# Altium schematic symbol library jlcpcb_2025_04_capacitors_extended_0201.schlib: 1175 symbols (part 2 of 7) (continued)
## CC0201JRNPO8BN220
designator C?  Capacitance: 22pF  (hidden comment: *)
Capacitor, Ceramic (MLCC), 22pF, ±5%, 25V, NP0, ±5%, SMD 0201; Manufacturer: YAGEO; Manufacturer Part Number: CC0201JRNPO8BN220; Package Size: 0201; JLCPCB Basic Part: No; JLCPCB Part Number: C526934; Supplier 1: LCSC; Category: Capacitors - MLCC; Supplier Part Number 1: C526934; Tolerance: ±5%; Voltage Rating: 25V; Temperature Coefficient: NP0; RoHS: Yes; ComponentLink1Description: Datasheet; ComponentLink1URL: https://wmsc.lcsc.com/wmsc/upload/file/pdf/v2/lcsc/2005222137_YAGEO-CC0201JRNPO8BN220_C526934.pdf; ComponentLink2Description: JLCPCB Part URL; ComponentLink2URL: https://jlcpcb.com/partdetail/C526934; ComponentLink3Description: LCSC Part URL; ComponentLink3URL: https://lcsc.com/product-detail/Multilayer-Ceramic-Capacitors-MLCC---SMD-SMT_YAGEO-YAGEO-CC0201JRNPO8BN220_C526934.html
footprint CAP-0201 (0201 (0603M) Capacitor)
pins: 1, 2

## CC0201JRNPO8BN270
designator C?  Capacitance: 27pF  (hidden comment: *)
Capacitor, Ceramic (MLCC), 27pF, ±5%, 25V, NP0, ±5%, SMD 0201; Manufacturer: YAGEO; Manufacturer Part Number: CC0201JRNPO8BN270; Package Size: 0201; JLCPCB Basic Part: No; JLCPCB Part Number: C272876; Supplier 1: LCSC; Category: Capacitors - MLCC; Supplier Part Number 1: C272876; Tolerance: ±5%; Voltage Rating: 25V; Temperature Coefficient: NP0; RoHS: Yes; ComponentLink1Description: Datasheet; ComponentLink1URL: https://wmsc.lcsc.com/wmsc/upload/file/pdf/v2/lcsc/2304140030_YAGEO-CC0201JRNPO8BN270_C272876.pdf; ComponentLink2Description: JLCPCB Part URL; ComponentLink2URL: https://jlcpcb.com/partdetail/C272876; ComponentLink3Description: LCSC Part URL; ComponentLink3URL: https://lcsc.com/product-detail/Multilayer-Ceramic-Capacitors-MLCC---SMD-SMT_YAGEO-YAGEO-CC0201JRNPO8BN270_C272876.html
footprint CAP-0201 (0201 (0603M) Capacitor)
pins: 1, 2

## CC0201JRNPO8BN330
designator C?  Capacitance: 33pF  (hidden comment: *)
Capacitor, Ceramic (MLCC), 33pF, ±5%, 25V, NP0, ±5%, SMD 0201; Manufacturer: YAGEO; Manufacturer Part Number: CC0201JRNPO8BN330; Package Size: 0201; JLCPCB Basic Part: No; JLCPCB Part Number: C513616; Supplier 1: LCSC; Category: Capacitors - MLCC; Supplier Part Number 1: C513616; Tolerance: ±5%; Voltage Rating: 25V; Temperature Coefficient: NP0; RoHS: Yes; ComponentLink1Description: Datasheet; ComponentLink1URL: https://wmsc.lcsc.com/wmsc/upload/file/pdf/v2/lcsc/2004231433_YAGEO-CC0201JRNPO8BN330_C513616.pdf; ComponentLink2Description: JLCPCB Part URL; ComponentLink2URL: https://jlcpcb.com/partdetail/C513616; ComponentLink3Description: LCSC Part URL; ComponentLink3URL: https://lcsc.com/product-detail/Multilayer-Ceramic-Capacitors-MLCC---SMD-SMT_YAGEO-YAGEO-CC0201JRNPO8BN330_C513616.html
footprint CAP-0201 (0201 (0603M) Capacitor)
pins: 1, 2

## CC0201JRNPO8BN680
designator C?  Capacitance: 68pF  (hidden comment: *)
Capacitor, Ceramic (MLCC), 68pF, ±5%, 25V, NP0, ±5%, SMD 0201; Manufacturer: YAGEO; Manufacturer Part Number: CC0201JRNPO8BN680; Package Size: 0201; JLCPCB Basic Part: No; JLCPCB Part Number: C309452; Supplier 1: LCSC; Category: Capacitors - MLCC; Supplier Part Number 1: C309452; Tolerance: ±5%; Voltage Rating: 25V; Temperature Coefficient: NP0; RoHS: Yes; ComponentLink1Description: Datasheet; ComponentLink1URL: https://wmsc.lcsc.com/wmsc/upload/file/pdf/v2/lcsc/2304140030_YAGEO-CC0201JRNPO8BN680_C309452.pdf; ComponentLink2Description: JLCPCB Part URL; ComponentLink2URL: https://jlcpcb.com/partdetail/C309452; ComponentLink3Description: LCSC Part URL; ComponentLink3URL: https://lcsc.com/product-detail/Multilayer-Ceramic-Capacitors-MLCC---SMD-SMT_YAGEO-YAGEO-CC0201JRNPO8BN680_C309452.html
footprint CAP-0201 (0201 (0603M) Capacitor)
pins: 1, 2

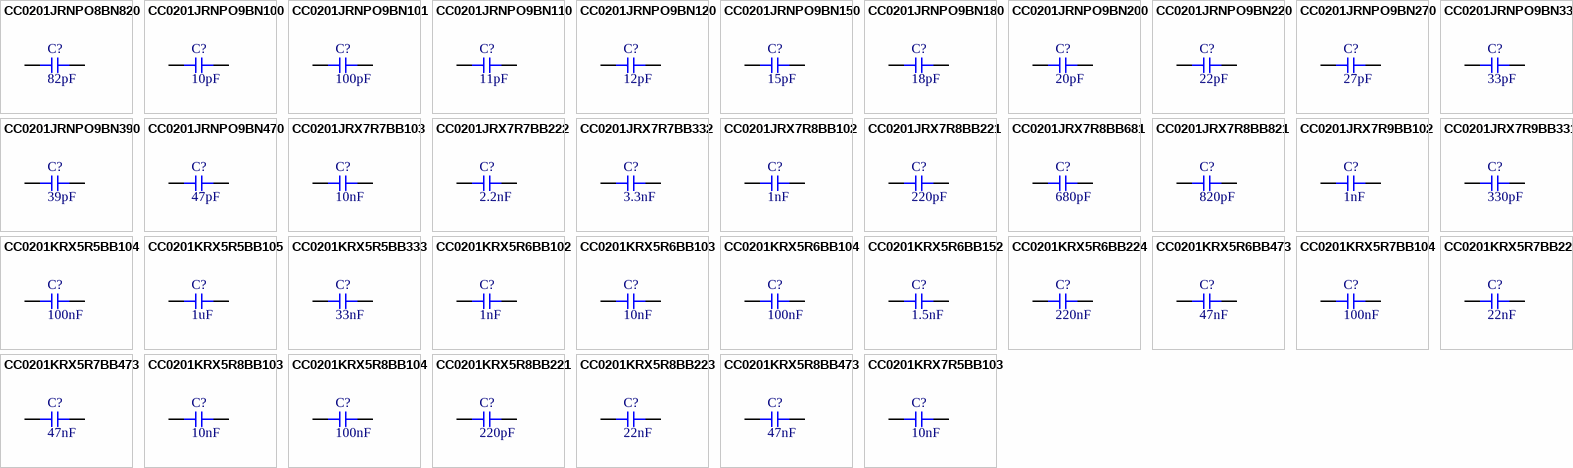
[diagram p7: symbols CC0201JRNPO8BN820 to CC0201KRX7R5BB103]

## CC0201JRNPO8BN820
designator C?  Capacitance: 82pF  (hidden comment: *)
Capacitor, Ceramic (MLCC), 82pF, ±5%, 25V, NP0, ±5%, SMD 0201; Manufacturer: YAGEO; Manufacturer Part Number: CC0201JRNPO8BN820; Package Size: 0201; JLCPCB Basic Part: No; JLCPCB Part Number: C526938; Supplier 1: LCSC; Category: Capacitors - MLCC; Supplier Part Number 1: C526938; Tolerance: ±5%; Voltage Rating: 25V; Temperature Coefficient: NP0; RoHS: Yes; ComponentLink1Description: Datasheet; ComponentLink1URL: https://wmsc.lcsc.com/wmsc/upload/file/pdf/v2/lcsc/2006101834_YAGEO-CC0201JRNPO8BN820_C526938.pdf; ComponentLink2Description: JLCPCB Part URL; ComponentLink2URL: https://jlcpcb.com/partdetail/C526938; ComponentLink3Description: LCSC Part URL; ComponentLink3URL: https://lcsc.com/product-detail/Multilayer-Ceramic-Capacitors-MLCC---SMD-SMT_YAGEO-YAGEO-CC0201JRNPO8BN820_C526938.html
footprint CAP-0201 (0201 (0603M) Capacitor)
pins: 1, 2

## CC0201JRNPO9BN100
designator C?  Capacitance: 10pF  (hidden comment: *)
Capacitor, Ceramic (MLCC), 10pF, ±5%, 50V, NP0, ±5%, SMD 0201; Manufacturer: YAGEO; Manufacturer Part Number: CC0201JRNPO9BN100; Package Size: 0201; JLCPCB Basic Part: No; JLCPCB Part Number: C272871; Supplier 1: LCSC; Category: Capacitors - MLCC; Supplier Part Number 1: C272871; Tolerance: ±5%; Voltage Rating: 50V; Temperature Coefficient: NP0; RoHS: Yes; ComponentLink1Description: Datasheet; ComponentLink1URL: https://wmsc.lcsc.com/wmsc/upload/file/pdf/v2/lcsc/2304140030_YAGEO-CC0201JRNPO9BN100_C272871.pdf; ComponentLink2Description: JLCPCB Part URL; ComponentLink2URL: https://jlcpcb.com/partdetail/C272871; ComponentLink3Description: LCSC Part URL; ComponentLink3URL: https://lcsc.com/product-detail/Multilayer-Ceramic-Capacitors-MLCC---SMD-SMT_YAGEO-YAGEO-CC0201JRNPO9BN100_C272871.html
footprint CAP-0201 (0201 (0603M) Capacitor)
pins: 1, 2

## CC0201JRNPO9BN101
designator C?  Capacitance: 100pF  (hidden comment: *)
Capacitor, Ceramic (MLCC), 100pF, ±5%, 50V, NP0, ±5%, SMD 0201; Manufacturer: YAGEO; Manufacturer Part Number: CC0201JRNPO9BN101; Package Size: 0201; JLCPCB Basic Part: No; JLCPCB Part Number: C272870; Supplier 1: LCSC; Category: Capacitors - MLCC; Supplier Part Number 1: C272870; Tolerance: ±5%; Voltage Rating: 50V; Temperature Coefficient: NP0; RoHS: Yes; ComponentLink1Description: Datasheet; ComponentLink1URL: https://wmsc.lcsc.com/wmsc/upload/file/pdf/v2/lcsc/2304140030_YAGEO-CC0201JRNPO9BN101_C272870.pdf; ComponentLink2Description: JLCPCB Part URL; ComponentLink2URL: https://jlcpcb.com/partdetail/C272870; ComponentLink3Description: LCSC Part URL; ComponentLink3URL: https://lcsc.com/product-detail/Multilayer-Ceramic-Capacitors-MLCC---SMD-SMT_YAGEO-YAGEO-CC0201JRNPO9BN101_C272870.html
footprint CAP-0201 (0201 (0603M) Capacitor)
pins: 1, 2

## CC0201JRNPO9BN110
designator C?  Capacitance: 11pF  (hidden comment: *)
Capacitor, Ceramic (MLCC), 11pF, ±5%, 50V, NP0, ±5%, SMD 0201; Manufacturer: YAGEO; Manufacturer Part Number: CC0201JRNPO9BN110; Package Size: 0201; JLCPCB Basic Part: No; JLCPCB Part Number: C541208; Supplier 1: LCSC; Category: Capacitors - MLCC; Supplier Part Number 1: C541208; Tolerance: ±5%; Voltage Rating: 50V; Temperature Coefficient: NP0; RoHS: Yes; ComponentLink1Description: Datasheet; ComponentLink1URL: https://wmsc.lcsc.com/wmsc/upload/file/pdf/v2/lcsc/2006151109_YAGEO-CC0201JRNPO9BN110_C541208.pdf; ComponentLink2Description: JLCPCB Part URL; ComponentLink2URL: https://jlcpcb.com/partdetail/C541208; ComponentLink3Description: LCSC Part URL; ComponentLink3URL: https://lcsc.com/product-detail/Multilayer-Ceramic-Capacitors-MLCC---SMD-SMT_YAGEO-YAGEO-CC0201JRNPO9BN110_C541208.html
footprint CAP-0201 (0201 (0603M) Capacitor)
pins: 1, 2

## CC0201JRNPO9BN120
designator C?  Capacitance: 12pF  (hidden comment: *)
Capacitor, Ceramic (MLCC), 12pF, ±5%, 50V, NP0, ±5%, SMD 0201; Manufacturer: YAGEO; Manufacturer Part Number: CC0201JRNPO9BN120; Package Size: 0201; JLCPCB Basic Part: No; JLCPCB Part Number: C277478; Supplier 1: LCSC; Category: Capacitors - MLCC; Supplier Part Number 1: C277478; Tolerance: ±5%; Voltage Rating: 50V; Temperature Coefficient: NP0; RoHS: Yes; ComponentLink1Description: Datasheet; ComponentLink1URL: https://wmsc.lcsc.com/wmsc/upload/file/pdf/v2/lcsc/2304140030_YAGEO-CC0201JRNPO9BN120_C277478.pdf; ComponentLink2Description: JLCPCB Part URL; ComponentLink2URL: https://jlcpcb.com/partdetail/C277478; ComponentLink3Description: LCSC Part URL; ComponentLink3URL: https://lcsc.com/product-detail/Multilayer-Ceramic-Capacitors-MLCC---SMD-SMT_YAGEO-YAGEO-CC0201JRNPO9BN120_C277478.html
footprint CAP-0201 (0201 (0603M) Capacitor)
pins: 1, 2

## CC0201JRNPO9BN150
designator C?  Capacitance: 15pF  (hidden comment: *)
Capacitor, Ceramic (MLCC), 15pF, ±5%, 50V, NP0, ±5%, SMD 0201; Manufacturer: YAGEO; Manufacturer Part Number: CC0201JRNPO9BN150; Package Size: 0201; JLCPCB Basic Part: No; JLCPCB Part Number: C277480; Supplier 1: LCSC; Category: Capacitors - MLCC; Supplier Part Number 1: C277480; Tolerance: ±5%; Voltage Rating: 50V; Temperature Coefficient: NP0; RoHS: Yes; ComponentLink1Description: Datasheet; ComponentLink1URL: https://wmsc.lcsc.com/wmsc/upload/file/pdf/v2/lcsc/2304140030_YAGEO-CC0201JRNPO9BN150_C277480.pdf; ComponentLink2Description: JLCPCB Part URL; ComponentLink2URL: https://jlcpcb.com/partdetail/C277480; ComponentLink3Description: LCSC Part URL; ComponentLink3URL: https://lcsc.com/product-detail/Multilayer-Ceramic-Capacitors-MLCC---SMD-SMT_YAGEO-YAGEO-CC0201JRNPO9BN150_C277480.html
footprint CAP-0201 (0201 (0603M) Capacitor)
pins: 1, 2

## CC0201JRNPO9BN180
designator C?  Capacitance: 18pF  (hidden comment: *)
Capacitor, Ceramic (MLCC), 18pF, ±5%, 50V, NP0, ±5%, SMD 0201; Manufacturer: YAGEO; Manufacturer Part Number: CC0201JRNPO9BN180; Package Size: 0201; JLCPCB Basic Part: No; JLCPCB Part Number: C277474; Supplier 1: LCSC; Category: Capacitors - MLCC; Supplier Part Number 1: C277474; Tolerance: ±5%; Voltage Rating: 50V; Temperature Coefficient: NP0; RoHS: Yes; ComponentLink1Description: Datasheet; ComponentLink1URL: https://wmsc.lcsc.com/wmsc/upload/file/pdf/v2/lcsc/2304140030_YAGEO-CC0201JRNPO9BN180_C277474.pdf; ComponentLink2Description: JLCPCB Part URL; ComponentLink2URL: https://jlcpcb.com/partdetail/C277474; ComponentLink3Description: LCSC Part URL; ComponentLink3URL: https://lcsc.com/product-detail/Multilayer-Ceramic-Capacitors-MLCC---SMD-SMT_YAGEO-YAGEO-CC0201JRNPO9BN180_C277474.html
footprint CAP-0201 (0201 (0603M) Capacitor)
pins: 1, 2

## CC0201JRNPO9BN200
designator C?  Capacitance: 20pF  (hidden comment: *)
Capacitor, Ceramic (MLCC), 20pF, ±5%, 50V, NP0, ±5%, SMD 0201; Manufacturer: YAGEO; Manufacturer Part Number: CC0201JRNPO9BN200; Package Size: 0201; JLCPCB Basic Part: No; JLCPCB Part Number: C325444; Supplier 1: LCSC; Category: Capacitors - MLCC; Supplier Part Number 1: C325444; Tolerance: ±5%; Voltage Rating: 50V; Temperature Coefficient: NP0; RoHS: Yes; ComponentLink1Description: Datasheet; ComponentLink1URL: https://wmsc.lcsc.com/wmsc/upload/file/pdf/v2/lcsc/1811031142_YAGEO-CC0201JRNPO9BN200_C325444.pdf; ComponentLink2Description: JLCPCB Part URL; ComponentLink2URL: https://jlcpcb.com/partdetail/C325444; ComponentLink3Description: LCSC Part URL; ComponentLink3URL: https://lcsc.com/product-detail/Multilayer-Ceramic-Capacitors-MLCC---SMD-SMT_YAGEO-YAGEO-CC0201JRNPO9BN200_C325444.html
footprint CAP-0201 (0201 (0603M) Capacitor)
pins: 1, 2

## CC0201JRNPO9BN220
designator C?  Capacitance: 22pF  (hidden comment: *)
Capacitor, Ceramic (MLCC), 22pF, ±5%, 50V, NP0, ±5%, SMD 0201; Manufacturer: YAGEO; Manufacturer Part Number: CC0201JRNPO9BN220; Package Size: 0201; JLCPCB Basic Part: No; JLCPCB Part Number: C272881; Supplier 1: LCSC; Category: Capacitors - MLCC; Supplier Part Number 1: C272881; Tolerance: ±5%; Voltage Rating: 50V; Temperature Coefficient: NP0; RoHS: Yes; ComponentLink1Description: Datasheet; ComponentLink1URL: https://wmsc.lcsc.com/wmsc/upload/file/pdf/v2/lcsc/2304140030_YAGEO-CC0201JRNPO9BN220_C272881.pdf; ComponentLink2Description: JLCPCB Part URL; ComponentLink2URL: https://jlcpcb.com/partdetail/C272881; ComponentLink3Description: LCSC Part URL; ComponentLink3URL: https://lcsc.com/product-detail/Multilayer-Ceramic-Capacitors-MLCC---SMD-SMT_YAGEO-YAGEO-CC0201JRNPO9BN220_C272881.html
footprint CAP-0201 (0201 (0603M) Capacitor)
pins: 1, 2

## CC0201JRNPO9BN270
designator C?  Capacitance: 27pF  (hidden comment: *)
Capacitor, Ceramic (MLCC), 27pF, ±5%, 50V, NP0, ±5%, SMD 0201; Manufacturer: YAGEO; Manufacturer Part Number: CC0201JRNPO9BN270; Package Size: 0201; JLCPCB Basic Part: No; JLCPCB Part Number: C272868; Supplier 1: LCSC; Category: Capacitors - MLCC; Supplier Part Number 1: C272868; Tolerance: ±5%; Voltage Rating: 50V; Temperature Coefficient: NP0; RoHS: Yes; ComponentLink1Description: Datasheet; ComponentLink1URL: https://wmsc.lcsc.com/wmsc/upload/file/pdf/v2/lcsc/2304140030_YAGEO-CC0201JRNPO9BN270_C272868.pdf; ComponentLink2Description: JLCPCB Part URL; ComponentLink2URL: https://jlcpcb.com/partdetail/C272868; ComponentLink3Description: LCSC Part URL; ComponentLink3URL: https://lcsc.com/product-detail/Multilayer-Ceramic-Capacitors-MLCC---SMD-SMT_YAGEO-YAGEO-CC0201JRNPO9BN270_C272868.html
footprint CAP-0201 (0201 (0603M) Capacitor)
pins: 1, 2

## CC0201JRNPO9BN330
designator C?  Capacitance: 33pF  (hidden comment: *)
Capacitor, Ceramic (MLCC), 33pF, ±5%, 50V, NP0, ±5%, SMD 0201; Manufacturer: YAGEO; Manufacturer Part Number: CC0201JRNPO9BN330; Package Size: 0201; JLCPCB Basic Part: No; JLCPCB Part Number: C277477; Supplier 1: LCSC; Category: Capacitors - MLCC; Supplier Part Number 1: C277477; Tolerance: ±5%; Voltage Rating: 50V; Temperature Coefficient: NP0; RoHS: Yes; ComponentLink1Description: Datasheet; ComponentLink1URL: https://wmsc.lcsc.com/wmsc/upload/file/pdf/v2/lcsc/2304140030_YAGEO-CC0201JRNPO9BN330_C277477.pdf; ComponentLink2Description: JLCPCB Part URL; ComponentLink2URL: https://jlcpcb.com/partdetail/C277477; ComponentLink3Description: LCSC Part URL; ComponentLink3URL: https://lcsc.com/product-detail/Multilayer-Ceramic-Capacitors-MLCC---SMD-SMT_YAGEO-YAGEO-CC0201JRNPO9BN330_C277477.html
footprint CAP-0201 (0201 (0603M) Capacitor)
pins: 1, 2

## CC0201JRNPO9BN390
designator C?  Capacitance: 39pF  (hidden comment: *)
Capacitor, Ceramic (MLCC), 39pF, ±5%, 50V, NP0, ±5%, SMD 0201; Manufacturer: YAGEO; Manufacturer Part Number: CC0201JRNPO9BN390; Package Size: 0201; JLCPCB Basic Part: No; JLCPCB Part Number: C277472; Supplier 1: LCSC; Category: Capacitors - MLCC; Supplier Part Number 1: C277472; Tolerance: ±5%; Voltage Rating: 50V; Temperature Coefficient: NP0; RoHS: Yes; ComponentLink1Description: Datasheet; ComponentLink1URL: https://wmsc.lcsc.com/wmsc/upload/file/pdf/v2/lcsc/2304140030_YAGEO-CC0201JRNPO9BN390_C277472.pdf; ComponentLink2Description: JLCPCB Part URL; ComponentLink2URL: https://jlcpcb.com/partdetail/C277472; ComponentLink3Description: LCSC Part URL; ComponentLink3URL: https://lcsc.com/product-detail/Multilayer-Ceramic-Capacitors-MLCC---SMD-SMT_YAGEO-YAGEO-CC0201JRNPO9BN390_C277472.html
footprint CAP-0201 (0201 (0603M) Capacitor)
pins: 1, 2

## CC0201JRNPO9BN470
designator C?  Capacitance: 47pF  (hidden comment: *)
Capacitor, Ceramic (MLCC), 47pF, ±5%, 50V, NP0, ±5%, SMD 0201; Manufacturer: YAGEO; Manufacturer Part Number: CC0201JRNPO9BN470; Package Size: 0201; JLCPCB Basic Part: No; JLCPCB Part Number: C272867; Supplier 1: LCSC; Category: Capacitors - MLCC; Supplier Part Number 1: C272867; Tolerance: ±5%; Voltage Rating: 50V; Temperature Coefficient: NP0; RoHS: Yes; ComponentLink1Description: Datasheet; ComponentLink1URL: https://wmsc.lcsc.com/wmsc/upload/file/pdf/v2/lcsc/2304140030_YAGEO-CC0201JRNPO9BN470_C272867.pdf; ComponentLink2Description: JLCPCB Part URL; ComponentLink2URL: https://jlcpcb.com/partdetail/C272867; ComponentLink3Description: LCSC Part URL; ComponentLink3URL: https://lcsc.com/product-detail/Multilayer-Ceramic-Capacitors-MLCC---SMD-SMT_YAGEO-YAGEO-CC0201JRNPO9BN470_C272867.html
footprint CAP-0201 (0201 (0603M) Capacitor)
pins: 1, 2

## CC0201JRX7R7BB103
designator C?  Capacitance: 10nF  (hidden comment: *)
Capacitor, Ceramic (MLCC), 10nF, ±5%, 16V, X7R, ±5%, SMD 0201; Manufacturer: YAGEO; Manufacturer Part Number: CC0201JRX7R7BB103; Package Size: 0201; JLCPCB Basic Part: No; JLCPCB Part Number: C526939; Supplier 1: LCSC; Category: Capacitors - MLCC; Supplier Part Number 1: C526939; Tolerance: ±5%; Voltage Rating: 16V; Temperature Coefficient: X7R; RoHS: Yes; ComponentLink1Description: Datasheet; ComponentLink1URL: https://wmsc.lcsc.com/wmsc/upload/file/pdf/v2/lcsc/2005222137_YAGEO-CC0201JRX7R7BB103_C526939.pdf; ComponentLink2Description: JLCPCB Part URL; ComponentLink2URL: https://jlcpcb.com/partdetail/C526939; ComponentLink3Description: LCSC Part URL; ComponentLink3URL: https://lcsc.com/product-detail/Multilayer-Ceramic-Capacitors-MLCC---SMD-SMT_YAGEO-YAGEO-CC0201JRX7R7BB103_C526939.html
footprint CAP-0201 (0201 (0603M) Capacitor)
pins: 1, 2

## CC0201JRX7R7BB222
designator C?  Capacitance: 2.2nF  (hidden comment: *)
Capacitor, Ceramic (MLCC), 2.2nF, ±5%, 16V, X7R, ±5%, SMD 0201; Manufacturer: YAGEO; Manufacturer Part Number: CC0201JRX7R7BB222; Package Size: 0201; JLCPCB Basic Part: No; JLCPCB Part Number: C526940; Supplier 1: LCSC; Category: Capacitors - MLCC; Supplier Part Number 1: C526940; Tolerance: ±5%; Voltage Rating: 16V; Temperature Coefficient: X7R; RoHS: Yes; ComponentLink1Description: Datasheet; ComponentLink1URL: https://wmsc.lcsc.com/wmsc/upload/file/pdf/v2/lcsc/2005261832_YAGEO-CC0201JRX7R7BB222_C526940.pdf; ComponentLink2Description: JLCPCB Part URL; ComponentLink2URL: https://jlcpcb.com/partdetail/C526940; ComponentLink3Description: LCSC Part URL; ComponentLink3URL: https://lcsc.com/product-detail/Multilayer-Ceramic-Capacitors-MLCC---SMD-SMT_YAGEO-YAGEO-CC0201JRX7R7BB222_C526940.html
footprint CAP-0201 (0201 (0603M) Capacitor)
pins: 1, 2

## CC0201JRX7R7BB332
designator C?  Capacitance: 3.3nF  (hidden comment: *)
Capacitor, Ceramic (MLCC), 3.3nF, ±5%, 16V, X7R, ±5%, SMD 0201; Manufacturer: YAGEO; Manufacturer Part Number: CC0201JRX7R7BB332; Package Size: 0201; JLCPCB Basic Part: No; JLCPCB Part Number: C541322; Supplier 1: LCSC; Category: Capacitors - MLCC; Supplier Part Number 1: C541322; Tolerance: ±5%; Voltage Rating: 16V; Temperature Coefficient: X7R; RoHS: Yes; ComponentLink1Description: Datasheet; ComponentLink1URL: https://wmsc.lcsc.com/wmsc/upload/file/pdf/v2/lcsc/2006151110_YAGEO-CC0201JRX7R7BB332_C541322.pdf; ComponentLink2Description: JLCPCB Part URL; ComponentLink2URL: https://jlcpcb.com/partdetail/C541322; ComponentLink3Description: LCSC Part URL; ComponentLink3URL: https://lcsc.com/product-detail/Multilayer-Ceramic-Capacitors-MLCC---SMD-SMT_YAGEO-YAGEO-CC0201JRX7R7BB332_C541322.html
footprint CAP-0201 (0201 (0603M) Capacitor)
pins: 1, 2

## CC0201JRX7R8BB102
designator C?  Capacitance: 1nF  (hidden comment: *)
Capacitor, Ceramic (MLCC), 1nF, ±5%, 25V, X7R, ±5%, SMD 0201; Manufacturer: YAGEO; Manufacturer Part Number: CC0201JRX7R8BB102; Package Size: 0201; JLCPCB Basic Part: No; JLCPCB Part Number: C526941; Supplier 1: LCSC; Category: Capacitors - MLCC; Supplier Part Number 1: C526941; Tolerance: ±5%; Voltage Rating: 25V; Temperature Coefficient: X7R; RoHS: Yes; ComponentLink1Description: Datasheet; ComponentLink1URL: https://wmsc.lcsc.com/wmsc/upload/file/pdf/v2/lcsc/2005141732_YAGEO-CC0201JRX7R8BB102_C526941.pdf; ComponentLink2Description: JLCPCB Part URL; ComponentLink2URL: https://jlcpcb.com/partdetail/C526941; ComponentLink3Description: LCSC Part URL; ComponentLink3URL: https://lcsc.com/product-detail/Multilayer-Ceramic-Capacitors-MLCC---SMD-SMT_YAGEO-YAGEO-CC0201JRX7R8BB102_C526941.html
footprint CAP-0201 (0201 (0603M) Capacitor)
pins: 1, 2

## CC0201JRX7R8BB221
designator C?  Capacitance: 220pF  (hidden comment: *)
Capacitor, Ceramic (MLCC), 220pF, ±5%, 25V, X7R, ±5%, SMD 0201; Manufacturer: YAGEO; Manufacturer Part Number: CC0201JRX7R8BB221; Package Size: 0201; JLCPCB Basic Part: No; JLCPCB Part Number: C541323; Supplier 1: LCSC; Category: Capacitors - MLCC; Supplier Part Number 1: C541323; Tolerance: ±5%; Voltage Rating: 25V; Temperature Coefficient: X7R; RoHS: Yes; ComponentLink1Description: Datasheet; ComponentLink1URL: https://wmsc.lcsc.com/wmsc/upload/file/pdf/v2/lcsc/2006151110_YAGEO-CC0201JRX7R8BB221_C541323.pdf; ComponentLink2Description: JLCPCB Part URL; ComponentLink2URL: https://jlcpcb.com/partdetail/C541323; ComponentLink3Description: LCSC Part URL; ComponentLink3URL: https://lcsc.com/product-detail/Multilayer-Ceramic-Capacitors-MLCC---SMD-SMT_YAGEO-YAGEO-CC0201JRX7R8BB221_C541323.html
footprint CAP-0201 (0201 (0603M) Capacitor)
pins: 1, 2

## CC0201JRX7R8BB681
designator C?  Capacitance: 680pF  (hidden comment: *)
Capacitor, Ceramic (MLCC), 680pF, ±5%, 25V, X7R, ±5%, SMD 0201; Manufacturer: YAGEO; Manufacturer Part Number: CC0201JRX7R8BB681; Package Size: 0201; JLCPCB Basic Part: No; JLCPCB Part Number: C541326; Supplier 1: LCSC; Category: Capacitors - MLCC; Supplier Part Number 1: C541326; Tolerance: ±5%; Voltage Rating: 25V; Temperature Coefficient: X7R; RoHS: Yes; ComponentLink1Description: Datasheet; ComponentLink1URL: https://wmsc.lcsc.com/wmsc/upload/file/pdf/v2/lcsc/2006151111_YAGEO-CC0201JRX7R8BB681_C541326.pdf; ComponentLink2Description: JLCPCB Part URL; ComponentLink2URL: https://jlcpcb.com/partdetail/C541326; ComponentLink3Description: LCSC Part URL; ComponentLink3URL: https://lcsc.com/product-detail/Multilayer-Ceramic-Capacitors-MLCC---SMD-SMT_YAGEO-YAGEO-CC0201JRX7R8BB681_C541326.html
footprint CAP-0201 (0201 (0603M) Capacitor)
pins: 1, 2

## CC0201JRX7R8BB821
designator C?  Capacitance: 820pF  (hidden comment: *)
Capacitor, Ceramic (MLCC), 820pF, ±5%, 25V, X7R, ±5%, SMD 0201; Manufacturer: YAGEO; Manufacturer Part Number: CC0201JRX7R8BB821; Package Size: 0201; JLCPCB Basic Part: No; JLCPCB Part Number: C541327; Supplier 1: LCSC; Category: Capacitors - MLCC; Supplier Part Number 1: C541327; Tolerance: ±5%; Voltage Rating: 25V; Temperature Coefficient: X7R; RoHS: Yes; ComponentLink1Description: Datasheet; ComponentLink1URL: https://wmsc.lcsc.com/wmsc/upload/file/pdf/v2/lcsc/2006151111_YAGEO-CC0201JRX7R8BB821_C541327.pdf; ComponentLink2Description: JLCPCB Part URL; ComponentLink2URL: https://jlcpcb.com/partdetail/C541327; ComponentLink3Description: LCSC Part URL; ComponentLink3URL: https://lcsc.com/product-detail/Multilayer-Ceramic-Capacitors-MLCC---SMD-SMT_YAGEO-YAGEO-CC0201JRX7R8BB821_C541327.html
footprint CAP-0201 (0201 (0603M) Capacitor)
pins: 1, 2

## CC0201JRX7R9BB102
designator C?  Capacitance: 1nF  (hidden comment: *)
Capacitor, Ceramic (MLCC), 1nF, ±5%, 50V, X7R, ±5%, SMD 0201; Manufacturer: YAGEO; Manufacturer Part Number: CC0201JRX7R9BB102; Package Size: 0201; JLCPCB Basic Part: No; JLCPCB Part Number: C541320; Supplier 1: LCSC; Category: Capacitors - MLCC; Supplier Part Number 1: C541320; Tolerance: ±5%; Voltage Rating: 50V; Temperature Coefficient: X7R; RoHS: Yes; ComponentLink1Description: Datasheet; ComponentLink1URL: https://wmsc.lcsc.com/wmsc/upload/file/pdf/v2/lcsc/2006151110_YAGEO-CC0201JRX7R9BB102_C541320.pdf; ComponentLink2Description: JLCPCB Part URL; ComponentLink2URL: https://jlcpcb.com/partdetail/C541320; ComponentLink3Description: LCSC Part URL; ComponentLink3URL: https://lcsc.com/product-detail/Multilayer-Ceramic-Capacitors-MLCC---SMD-SMT_YAGEO-YAGEO-CC0201JRX7R9BB102_C541320.html
footprint CAP-0201 (0201 (0603M) Capacitor)
pins: 1, 2

## CC0201JRX7R9BB331
designator C?  Capacitance: 330pF  (hidden comment: *)
Capacitor, Ceramic (MLCC), 330pF, ±5%, 50V, X7R, ±5%, SMD 0201; Manufacturer: YAGEO; Manufacturer Part Number: CC0201JRX7R9BB331; Package Size: 0201; JLCPCB Basic Part: No; JLCPCB Part Number: C526943; Supplier 1: LCSC; Category: Capacitors - MLCC; Supplier Part Number 1: C526943; Tolerance: ±5%; Voltage Rating: 50V; Temperature Coefficient: X7R; RoHS: Yes; ComponentLink1Description: Datasheet; ComponentLink1URL: https://wmsc.lcsc.com/wmsc/upload/file/pdf/v2/lcsc/2006101834_YAGEO-CC0201JRX7R9BB331_C526943.pdf; ComponentLink2Description: JLCPCB Part URL; ComponentLink2URL: https://jlcpcb.com/partdetail/C526943; ComponentLink3Description: LCSC Part URL; ComponentLink3URL: https://lcsc.com/product-detail/Multilayer-Ceramic-Capacitors-MLCC---SMD-SMT_YAGEO-YAGEO-CC0201JRX7R9BB331_C526943.html
footprint CAP-0201 (0201 (0603M) Capacitor)
pins: 1, 2

## CC0201KRX5R5BB104
designator C?  Capacitance: 100nF  (hidden comment: *)
Capacitor, Ceramic (MLCC), 100nF, ±10%, 6.3V, X5R, ±10%, SMD 0201; Manufacturer: YAGEO; Manufacturer Part Number: CC0201KRX5R5BB104; Package Size: 0201; JLCPCB Basic Part: No; JLCPCB Part Number: C190187; Supplier 1: LCSC; Category: Capacitors - MLCC; Supplier Part Number 1: C190187; Tolerance: ±10%; Voltage Rating: 6.3V; Temperature Coefficient: X5R; RoHS: Yes; ComponentLink1Description: Datasheet; ComponentLink1URL: https://wmsc.lcsc.com/wmsc/upload/file/pdf/v2/lcsc/2407081117_YAGEO-CC0201KRX5R5BB104_C190187.pdf; ComponentLink2Description: JLCPCB Part URL; ComponentLink2URL: https://jlcpcb.com/partdetail/C190187; ComponentLink3Description: LCSC Part URL; ComponentLink3URL: https://lcsc.com/product-detail/Multilayer-Ceramic-Capacitors-MLCC---SMD-SMT_YAGEO-YAGEO-CC0201KRX5R5BB104_C190187.html
footprint CAP-0201 (0201 (0603M) Capacitor)
pins: 1, 2

## CC0201KRX5R5BB105
designator C?  Capacitance: 1uF  (hidden comment: *)
Capacitor, Ceramic (MLCC), 1uF, ±10%, 6.3V, X5R, ±10%, SMD 0201; Manufacturer: YAGEO; Manufacturer Part Number: CC0201KRX5R5BB105; Package Size: 0201; JLCPCB Basic Part: No; JLCPCB Part Number: C541330; Supplier 1: LCSC; Category: Capacitors - MLCC; Supplier Part Number 1: C541330; Tolerance: ±10%; Voltage Rating: 6.3V; Temperature Coefficient: X5R; RoHS: Yes; ComponentLink1Description: Datasheet; ComponentLink1URL: https://wmsc.lcsc.com/wmsc/upload/file/pdf/v2/lcsc/2407081117_YAGEO-CC0201KRX5R5BB105_C541330.pdf; ComponentLink2Description: JLCPCB Part URL; ComponentLink2URL: https://jlcpcb.com/partdetail/C541330; ComponentLink3Description: LCSC Part URL; ComponentLink3URL: https://lcsc.com/product-detail/Multilayer-Ceramic-Capacitors-MLCC---SMD-SMT_YAGEO-YAGEO-CC0201KRX5R5BB105_C541330.html
footprint CAP-0201 (0201 (0603M) Capacitor)
pins: 1, 2

## CC0201KRX5R5BB333
designator C?  Capacitance: 33nF  (hidden comment: *)
Capacitor, Ceramic (MLCC), 33nF, ±10%, 6.3V, X5R, ±10%, SMD 0201; Manufacturer: YAGEO; Manufacturer Part Number: CC0201KRX5R5BB333; Package Size: 0201; JLCPCB Basic Part: No; JLCPCB Part Number: C505507; Supplier 1: LCSC; Category: Capacitors - MLCC; Supplier Part Number 1: C505507; Tolerance: ±10%; Voltage Rating: 6.3V; Temperature Coefficient: X5R; RoHS: Yes; ComponentLink1Description: Datasheet; ComponentLink1URL: https://wmsc.lcsc.com/wmsc/upload/file/pdf/v2/lcsc/2407081117_YAGEO-CC0201KRX5R5BB333_C505507.pdf; ComponentLink2Description: JLCPCB Part URL; ComponentLink2URL: https://jlcpcb.com/partdetail/C505507; ComponentLink3Description: LCSC Part URL; ComponentLink3URL: https://lcsc.com/product-detail/Multilayer-Ceramic-Capacitors-MLCC---SMD-SMT_YAGEO-YAGEO-CC0201KRX5R5BB333_C505507.html
footprint CAP-0201 (0201 (0603M) Capacitor)
pins: 1, 2

## CC0201KRX5R6BB102
designator C?  Capacitance: 1nF  (hidden comment: *)
Capacitor, Ceramic (MLCC), 1nF, ±10%, 10V, X5R, ±10%, SMD 0201; Manufacturer: YAGEO; Manufacturer Part Number: CC0201KRX5R6BB102; Package Size: 0201; JLCPCB Basic Part: No; JLCPCB Part Number: C541212; Supplier 1: LCSC; Category: Capacitors - MLCC; Supplier Part Number 1: C541212; Tolerance: ±10%; Voltage Rating: 10V; Temperature Coefficient: X5R; RoHS: Yes; ComponentLink1Description: Datasheet; ComponentLink1URL: https://wmsc.lcsc.com/wmsc/upload/file/pdf/v2/lcsc/2407081117_YAGEO-CC0201KRX5R6BB102_C541212.pdf; ComponentLink2Description: JLCPCB Part URL; ComponentLink2URL: https://jlcpcb.com/partdetail/C541212; ComponentLink3Description: LCSC Part URL; ComponentLink3URL: https://lcsc.com/product-detail/Multilayer-Ceramic-Capacitors-MLCC---SMD-SMT_YAGEO-YAGEO-CC0201KRX5R6BB102_C541212.html
footprint CAP-0201 (0201 (0603M) Capacitor)
pins: 1, 2

## CC0201KRX5R6BB103
designator C?  Capacitance: 10nF  (hidden comment: *)
Capacitor, Ceramic (MLCC), 10nF, ±10%, 10V, X5R, ±10%, SMD 0201; Manufacturer: YAGEO; Manufacturer Part Number: CC0201KRX5R6BB103; Package Size: 0201; JLCPCB Basic Part: No; JLCPCB Part Number: C272885; Supplier 1: LCSC; Category: Capacitors - MLCC; Supplier Part Number 1: C272885; Tolerance: ±10%; Voltage Rating: 10V; Temperature Coefficient: X5R; RoHS: Yes; ComponentLink1Description: Datasheet; ComponentLink1URL: https://wmsc.lcsc.com/wmsc/upload/file/pdf/v2/lcsc/2407081117_YAGEO-CC0201KRX5R6BB103_C272885.pdf; ComponentLink2Description: JLCPCB Part URL; ComponentLink2URL: https://jlcpcb.com/partdetail/C272885; ComponentLink3Description: LCSC Part URL; ComponentLink3URL: https://lcsc.com/product-detail/Multilayer-Ceramic-Capacitors-MLCC---SMD-SMT_YAGEO-YAGEO-CC0201KRX5R6BB103_C272885.html
footprint CAP-0201 (0201 (0603M) Capacitor)
pins: 1, 2

## CC0201KRX5R6BB104
designator C?  Capacitance: 100nF  (hidden comment: *)
Capacitor, Ceramic (MLCC), 100nF, ±10%, 10V, X5R, ±10%, SMD 0201; Manufacturer: YAGEO; Manufacturer Part Number: CC0201KRX5R6BB104; Package Size: 0201; JLCPCB Basic Part: No; JLCPCB Part Number: C190183; Supplier 1: LCSC; Category: Capacitors - MLCC; Supplier Part Number 1: C190183; Tolerance: ±10%; Voltage Rating: 10V; Temperature Coefficient: X5R; RoHS: Yes; ComponentLink1Description: Datasheet; ComponentLink1URL: https://wmsc.lcsc.com/wmsc/upload/file/pdf/v2/lcsc/2407081117_YAGEO-CC0201KRX5R6BB104_C190183.pdf; ComponentLink2Description: JLCPCB Part URL; ComponentLink2URL: https://jlcpcb.com/partdetail/C190183; ComponentLink3Description: LCSC Part URL; ComponentLink3URL: https://lcsc.com/product-detail/Multilayer-Ceramic-Capacitors-MLCC---SMD-SMT_YAGEO-YAGEO-CC0201KRX5R6BB104_C190183.html
footprint CAP-0201 (0201 (0603M) Capacitor)
pins: 1, 2

## CC0201KRX5R6BB152
designator C?  Capacitance: 1.5nF  (hidden comment: *)
Capacitor, Ceramic (MLCC), 1.5nF, ±10%, 10V, X5R, ±10%, SMD 0201; Manufacturer: YAGEO; Manufacturer Part Number: CC0201KRX5R6BB152; Package Size: 0201; JLCPCB Basic Part: No; JLCPCB Part Number: C2171564; Supplier 1: LCSC; Category: Capacitors - MLCC; Supplier Part Number 1: C2171564; Tolerance: ±10%; Voltage Rating: 10V; Temperature Coefficient: X5R; RoHS: Yes; ComponentLink1Description: Datasheet; ComponentLink1URL: https://wmsc.lcsc.com/wmsc/upload/file/pdf/v2/lcsc/2407081117_YAGEO-CC0201KRX5R6BB152_C2171564.pdf; ComponentLink2Description: JLCPCB Part URL; ComponentLink2URL: https://jlcpcb.com/partdetail/C2171564; ComponentLink3Description: LCSC Part URL; ComponentLink3URL: https://lcsc.com/product-detail/Multilayer-Ceramic-Capacitors-MLCC---SMD-SMT_YAGEO-YAGEO-CC0201KRX5R6BB152_C2171564.html
footprint CAP-0201 (0201 (0603M) Capacitor)
pins: 1, 2

## CC0201KRX5R6BB224
designator C?  Capacitance: 220nF  (hidden comment: *)
Capacitor, Ceramic (MLCC), 220nF, ±10%, 10V, X5R, ±10%, SMD 0201; Manufacturer: YAGEO; Manufacturer Part Number: CC0201KRX5R6BB224; Package Size: 0201; JLCPCB Basic Part: No; JLCPCB Part Number: C326658; Supplier 1: LCSC; Category: Capacitors - MLCC; Supplier Part Number 1: C326658; Tolerance: ±10%; Voltage Rating: 10V; Temperature Coefficient: X5R; RoHS: Yes; ComponentLink1Description: Datasheet; ComponentLink1URL: https://wmsc.lcsc.com/wmsc/upload/file/pdf/v2/lcsc/2407081117_YAGEO-CC0201KRX5R6BB224_C326658.pdf; ComponentLink2Description: JLCPCB Part URL; ComponentLink2URL: https://jlcpcb.com/partdetail/C326658; ComponentLink3Description: LCSC Part URL; ComponentLink3URL: https://lcsc.com/product-detail/Multilayer-Ceramic-Capacitors-MLCC---SMD-SMT_YAGEO-YAGEO-CC0201KRX5R6BB224_C326658.html
footprint CAP-0201 (0201 (0603M) Capacitor)
pins: 1, 2

## CC0201KRX5R6BB473
designator C?  Capacitance: 47nF  (hidden comment: *)
Capacitor, Ceramic (MLCC), 47nF, ±10%, 10V, X5R, ±10%, SMD 0201; Manufacturer: YAGEO; Manufacturer Part Number: CC0201KRX5R6BB473; Package Size: 0201; JLCPCB Basic Part: No; JLCPCB Part Number: C325447; Supplier 1: LCSC; Category: Capacitors - MLCC; Supplier Part Number 1: C325447; Tolerance: ±10%; Voltage Rating: 10V; Temperature Coefficient: X5R; RoHS: Yes; ComponentLink1Description: Datasheet; ComponentLink1URL: https://wmsc.lcsc.com/wmsc/upload/file/pdf/v2/lcsc/2407081117_YAGEO-CC0201KRX5R6BB473_C325447.pdf; ComponentLink2Description: JLCPCB Part URL; ComponentLink2URL: https://jlcpcb.com/partdetail/C325447; ComponentLink3Description: LCSC Part URL; ComponentLink3URL: https://lcsc.com/product-detail/Multilayer-Ceramic-Capacitors-MLCC---SMD-SMT_YAGEO-YAGEO-CC0201KRX5R6BB473_C325447.html
footprint CAP-0201 (0201 (0603M) Capacitor)
pins: 1, 2

## CC0201KRX5R7BB104
designator C?  Capacitance: 100nF  (hidden comment: *)
Capacitor, Ceramic (MLCC), 100nF, ±10%, 16V, X5R, ±10%, SMD 0201; Manufacturer: YAGEO; Manufacturer Part Number: CC0201KRX5R7BB104; Package Size: 0201; JLCPCB Basic Part: No; JLCPCB Part Number: C467016; Supplier 1: LCSC; Category: Capacitors - MLCC; Supplier Part Number 1: C467016; Tolerance: ±10%; Voltage Rating: 16V; Temperature Coefficient: X5R; RoHS: Yes; ComponentLink1Description: Datasheet; ComponentLink1URL: https://wmsc.lcsc.com/wmsc/upload/file/pdf/v2/lcsc/2407081117_YAGEO-CC0201KRX5R7BB104_C467016.pdf; ComponentLink2Description: JLCPCB Part URL; ComponentLink2URL: https://jlcpcb.com/partdetail/C467016; ComponentLink3Description: LCSC Part URL; ComponentLink3URL: https://lcsc.com/product-detail/Multilayer-Ceramic-Capacitors-MLCC---SMD-SMT_YAGEO-YAGEO-CC0201KRX5R7BB104_C467016.html
footprint CAP-0201 (0201 (0603M) Capacitor)
pins: 1, 2

## CC0201KRX5R7BB223
designator C?  Capacitance: 22nF  (hidden comment: *)
Capacitor, Ceramic (MLCC), 22nF, ±10%, 16V, X5R, ±10%, SMD 0201; Manufacturer: YAGEO; Manufacturer Part Number: CC0201KRX5R7BB223; Package Size: 0201; JLCPCB Basic Part: No; JLCPCB Part Number: C513652; Supplier 1: LCSC; Category: Capacitors - MLCC; Supplier Part Number 1: C513652; Tolerance: ±10%; Voltage Rating: 16V; Temperature Coefficient: X5R; RoHS: Yes; ComponentLink1Description: Datasheet; ComponentLink1URL: https://wmsc.lcsc.com/wmsc/upload/file/pdf/v2/lcsc/2407081117_YAGEO-CC0201KRX5R7BB223_C513652.pdf; ComponentLink2Description: JLCPCB Part URL; ComponentLink2URL: https://jlcpcb.com/partdetail/C513652; ComponentLink3Description: LCSC Part URL; ComponentLink3URL: https://lcsc.com/product-detail/Multilayer-Ceramic-Capacitors-MLCC---SMD-SMT_YAGEO-YAGEO-CC0201KRX5R7BB223_C513652.html
footprint CAP-0201 (0201 (0603M) Capacitor)
pins: 1, 2

## CC0201KRX5R7BB473
designator C?  Capacitance: 47nF  (hidden comment: *)
Capacitor, Ceramic (MLCC), 47nF, ±10%, 16V, X5R, ±10%, SMD 0201; Manufacturer: YAGEO; Manufacturer Part Number: CC0201KRX5R7BB473; Package Size: 0201; JLCPCB Basic Part: No; JLCPCB Part Number: C505465; Supplier 1: LCSC; Category: Capacitors - MLCC; Supplier Part Number 1: C505465; Tolerance: ±10%; Voltage Rating: 16V; Temperature Coefficient: X5R; RoHS: Yes; ComponentLink1Description: Datasheet; ComponentLink1URL: https://wmsc.lcsc.com/wmsc/upload/file/pdf/v2/lcsc/2407081117_YAGEO-CC0201KRX5R7BB473_C505465.pdf; ComponentLink2Description: JLCPCB Part URL; ComponentLink2URL: https://jlcpcb.com/partdetail/C505465; ComponentLink3Description: LCSC Part URL; ComponentLink3URL: https://lcsc.com/product-detail/Multilayer-Ceramic-Capacitors-MLCC---SMD-SMT_YAGEO-YAGEO-CC0201KRX5R7BB473_C505465.html
footprint CAP-0201 (0201 (0603M) Capacitor)
pins: 1, 2

## CC0201KRX5R8BB103
designator C?  Capacitance: 10nF  (hidden comment: *)
Capacitor, Ceramic (MLCC), 10nF, ±10%, 25V, X5R, ±10%, SMD 0201; Manufacturer: YAGEO; Manufacturer Part Number: CC0201KRX5R8BB103; Package Size: 0201; JLCPCB Basic Part: No; JLCPCB Part Number: C505483; Supplier 1: LCSC; Category: Capacitors - MLCC; Supplier Part Number 1: C505483; Tolerance: ±10%; Voltage Rating: 25V; Temperature Coefficient: X5R; RoHS: Yes; ComponentLink1Description: Datasheet; ComponentLink1URL: https://wmsc.lcsc.com/wmsc/upload/file/pdf/v2/lcsc/2407081117_YAGEO-CC0201KRX5R8BB103_C505483.pdf; ComponentLink2Description: JLCPCB Part URL; ComponentLink2URL: https://jlcpcb.com/partdetail/C505483; ComponentLink3Description: LCSC Part URL; ComponentLink3URL: https://lcsc.com/product-detail/Multilayer-Ceramic-Capacitors-MLCC---SMD-SMT_YAGEO-YAGEO-CC0201KRX5R8BB103_C505483.html
footprint CAP-0201 (0201 (0603M) Capacitor)
pins: 1, 2

## CC0201KRX5R8BB104
designator C?  Capacitance: 100nF  (hidden comment: *)
Capacitor, Ceramic (MLCC), 100nF, ±10%, 25V, X5R, ±10%, SMD 0201; Manufacturer: YAGEO; Manufacturer Part Number: CC0201KRX5R8BB104; Package Size: 0201; JLCPCB Basic Part: No; JLCPCB Part Number: C718252; Supplier 1: LCSC; Category: Capacitors - MLCC; Supplier Part Number 1: C718252; Tolerance: ±10%; Voltage Rating: 25V; Temperature Coefficient: X5R; RoHS: Yes; ComponentLink1Description: Datasheet; ComponentLink1URL: https://wmsc.lcsc.com/wmsc/upload/file/pdf/v2/lcsc/2407081117_YAGEO-CC0201KRX5R8BB104_C718252.pdf; ComponentLink2Description: JLCPCB Part URL; ComponentLink2URL: https://jlcpcb.com/partdetail/C718252; ComponentLink3Description: LCSC Part URL; ComponentLink3URL: https://lcsc.com/product-detail/Multilayer-Ceramic-Capacitors-MLCC---SMD-SMT_YAGEO-YAGEO-CC0201KRX5R8BB104_C718252.html
footprint CAP-0201 (0201 (0603M) Capacitor)
pins: 1, 2

## CC0201KRX5R8BB221
designator C?  Capacitance: 220pF  (hidden comment: *)
Capacitor, Ceramic (MLCC), 220pF, ±10%, 25V, X5R, ±10%, SMD 0201; Manufacturer: YAGEO; Manufacturer Part Number: CC0201KRX5R8BB221; Package Size: 0201; JLCPCB Basic Part: No; JLCPCB Part Number: C2930548; Supplier 1: LCSC; Category: Capacitors - MLCC; Supplier Part Number 1: C2930548; Tolerance: ±10%; Voltage Rating: 25V; Temperature Coefficient: X5R; RoHS: Yes; ComponentLink1Description: Datasheet; ComponentLink1URL: https://wmsc.lcsc.com/wmsc/upload/file/pdf/v2/lcsc/2407081117_YAGEO-CC0201KRX5R8BB221_C2930548.pdf; ComponentLink2Description: JLCPCB Part URL; ComponentLink2URL: https://jlcpcb.com/partdetail/C2930548; ComponentLink3Description: LCSC Part URL; ComponentLink3URL: https://lcsc.com/product-detail/Multilayer-Ceramic-Capacitors-MLCC---SMD-SMT_YAGEO-YAGEO-CC0201KRX5R8BB221_C2930548.html
footprint CAP-0201 (0201 (0603M) Capacitor)
pins: 1, 2

## CC0201KRX5R8BB223
designator C?  Capacitance: 22nF  (hidden comment: *)
Capacitor, Ceramic (MLCC), 22nF, ±10%, 25V, X5R, ±10%, SMD 0201; Manufacturer: YAGEO; Manufacturer Part Number: CC0201KRX5R8BB223; Package Size: 0201; JLCPCB Basic Part: No; JLCPCB Part Number: C505472; Supplier 1: LCSC; Category: Capacitors - MLCC; Supplier Part Number 1: C505472; Tolerance: ±10%; Voltage Rating: 25V; Temperature Coefficient: X5R; RoHS: Yes; ComponentLink1Description: Datasheet; ComponentLink1URL: https://wmsc.lcsc.com/wmsc/upload/file/pdf/v2/lcsc/2407081117_YAGEO-CC0201KRX5R8BB223_C505472.pdf; ComponentLink2Description: JLCPCB Part URL; ComponentLink2URL: https://jlcpcb.com/partdetail/C505472; ComponentLink3Description: LCSC Part URL; ComponentLink3URL: https://lcsc.com/product-detail/Multilayer-Ceramic-Capacitors-MLCC---SMD-SMT_YAGEO-YAGEO-CC0201KRX5R8BB223_C505472.html
footprint CAP-0201 (0201 (0603M) Capacitor)
pins: 1, 2

## CC0201KRX5R8BB473
designator C?  Capacitance: 47nF  (hidden comment: *)
Capacitor, Ceramic (MLCC), 47nF, ±10%, 25V, X5R, ±10%, SMD 0201; Manufacturer: YAGEO; Manufacturer Part Number: CC0201KRX5R8BB473; Package Size: 0201; JLCPCB Basic Part: No; JLCPCB Part Number: C2930549; Supplier 1: LCSC; Category: Capacitors - MLCC; Supplier Part Number 1: C2930549; Tolerance: ±10%; Voltage Rating: 25V; Temperature Coefficient: X5R; RoHS: Yes; ComponentLink1Description: Datasheet; ComponentLink1URL: https://wmsc.lcsc.com/wmsc/upload/file/pdf/v2/lcsc/2407081117_YAGEO-CC0201KRX5R8BB473_C2930549.pdf; ComponentLink2Description: JLCPCB Part URL; ComponentLink2URL: https://jlcpcb.com/partdetail/C2930549; ComponentLink3Description: LCSC Part URL; ComponentLink3URL: https://lcsc.com/product-detail/Multilayer-Ceramic-Capacitors-MLCC---SMD-SMT_YAGEO-YAGEO-CC0201KRX5R8BB473_C2930549.html
footprint CAP-0201 (0201 (0603M) Capacitor)
pins: 1, 2

## CC0201KRX7R5BB103
designator C?  Capacitance: 10nF  (hidden comment: *)
Capacitor, Ceramic (MLCC), 10nF, ±10%, 6.3V, X7R, ±10%, SMD 0201; Manufacturer: YAGEO; Manufacturer Part Number: CC0201KRX7R5BB103; Package Size: 0201; JLCPCB Basic Part: No; JLCPCB Part Number: C309453; Supplier 1: LCSC; Category: Capacitors - MLCC; Supplier Part Number 1: C309453; Tolerance: ±10%; Voltage Rating: 6.3V; Temperature Coefficient: X7R; RoHS: Yes; ComponentLink1Description: Datasheet; ComponentLink1URL: https://wmsc.lcsc.com/wmsc/upload/file/pdf/v2/lcsc/2304140030_YAGEO-CC0201KRX7R5BB103_C309453.pdf; ComponentLink2Description: JLCPCB Part URL; ComponentLink2URL: https://jlcpcb.com/partdetail/C309453; ComponentLink3Description: LCSC Part URL; ComponentLink3URL: https://lcsc.com/product-detail/Multilayer-Ceramic-Capacitors-MLCC---SMD-SMT_YAGEO-YAGEO-CC0201KRX7R5BB103_C309453.html
footprint CAP-0201 (0201 (0603M) Capacitor)
pins: 1, 2

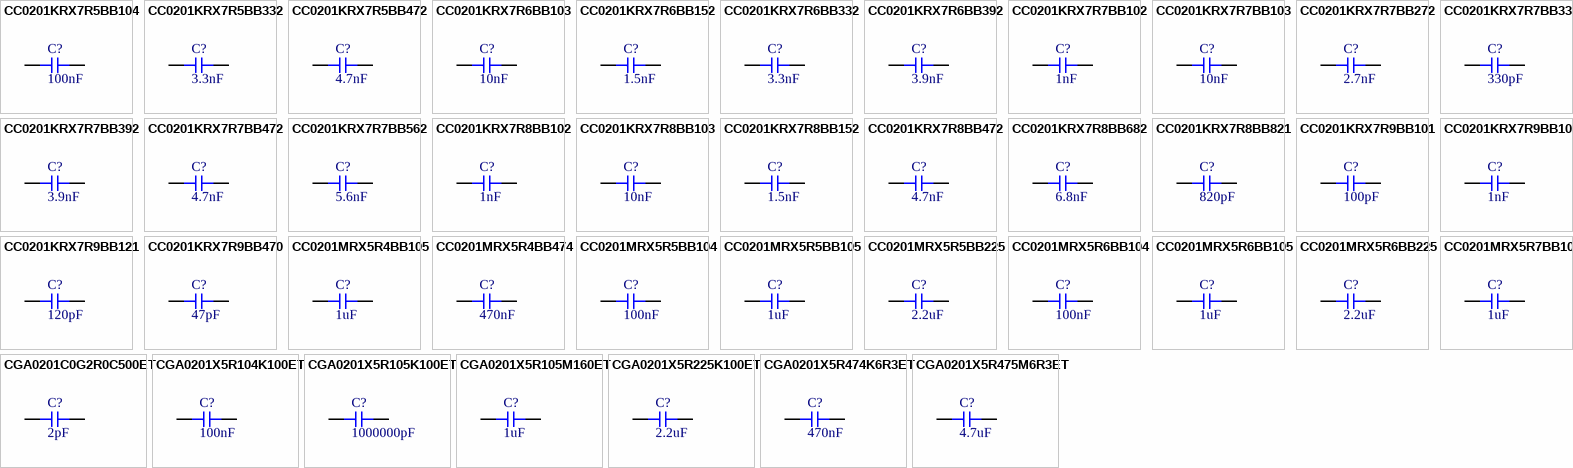
[diagram p8: symbols CC0201KRX7R5BB104 to CGA0201X5R475M6R3ET]

## CC0201KRX7R5BB104
designator C?  Capacitance: 100nF  (hidden comment: *)
Capacitor, Ceramic (MLCC), 100nF, ±10%, 6.3V, X7R, ±10%, SMD 0201; Manufacturer: YAGEO; Manufacturer Part Number: CC0201KRX7R5BB104; Package Size: 0201; JLCPCB Basic Part: No; JLCPCB Part Number: C1882920; Supplier 1: LCSC; Category: Capacitors - MLCC; Supplier Part Number 1: C1882920; Tolerance: ±10%; Voltage Rating: 6.3V; Temperature Coefficient: X7R; RoHS: Yes; ComponentLink1Description: Datasheet; ComponentLink1URL: https://wmsc.lcsc.com/wmsc/upload/file/pdf/v2/lcsc/2101281808_YAGEO-CC0201KRX7R5BB104_C1882920.pdf; ComponentLink2Description: JLCPCB Part URL; ComponentLink2URL: https://jlcpcb.com/partdetail/C1882920; ComponentLink3Description: LCSC Part URL; ComponentLink3URL: https://lcsc.com/product-detail/Multilayer-Ceramic-Capacitors-MLCC---SMD-SMT_YAGEO-YAGEO-CC0201KRX7R5BB104_C1882920.html
footprint CAP-0201 (0201 (0603M) Capacitor)
pins: 1, 2

## CC0201KRX7R5BB332
designator C?  Capacitance: 3.3nF  (hidden comment: *)
Capacitor, Ceramic (MLCC), 3.3nF, ±10%, 6.3V, X7R, ±10%, SMD 0201; Manufacturer: YAGEO; Manufacturer Part Number: CC0201KRX7R5BB332; Package Size: 0201; JLCPCB Basic Part: No; JLCPCB Part Number: C526948; Supplier 1: LCSC; Category: Capacitors - MLCC; Supplier Part Number 1: C526948; Tolerance: ±10%; Voltage Rating: 6.3V; Temperature Coefficient: X7R; RoHS: Yes; ComponentLink1Description: Datasheet; ComponentLink1URL: https://wmsc.lcsc.com/wmsc/upload/file/pdf/v2/lcsc/2007091834_YAGEO-CC0201KRX7R5BB332_C526948.pdf; ComponentLink2Description: JLCPCB Part URL; ComponentLink2URL: https://jlcpcb.com/partdetail/C526948; ComponentLink3Description: LCSC Part URL; ComponentLink3URL: https://lcsc.com/product-detail/Multilayer-Ceramic-Capacitors-MLCC---SMD-SMT_YAGEO-YAGEO-CC0201KRX7R5BB332_C526948.html
footprint CAP-0201 (0201 (0603M) Capacitor)
pins: 1, 2

## CC0201KRX7R5BB472
designator C?  Capacitance: 4.7nF  (hidden comment: *)
Capacitor, Ceramic (MLCC), 4.7nF, ±10%, 6.3V, X7R, ±10%, SMD 0201; Manufacturer: YAGEO; Manufacturer Part Number: CC0201KRX7R5BB472; Package Size: 0201; JLCPCB Basic Part: No; JLCPCB Part Number: C526949; Supplier 1: LCSC; Category: Capacitors - MLCC; Supplier Part Number 1: C526949; Tolerance: ±10%; Voltage Rating: 6.3V; Temperature Coefficient: X7R; RoHS: Yes; ComponentLink1Description: Datasheet; ComponentLink1URL: https://wmsc.lcsc.com/wmsc/upload/file/pdf/v2/lcsc/2304140030_YAGEO-CC0201KRX7R5BB472_C526949.pdf; ComponentLink2Description: JLCPCB Part URL; ComponentLink2URL: https://jlcpcb.com/partdetail/C526949; ComponentLink3Description: LCSC Part URL; ComponentLink3URL: https://lcsc.com/product-detail/Multilayer-Ceramic-Capacitors-MLCC---SMD-SMT_YAGEO-YAGEO-CC0201KRX7R5BB472_C526949.html
footprint CAP-0201 (0201 (0603M) Capacitor)
pins: 1, 2
